# Altium integrated library esd_library.IntLib: 994 symbols (part 4 of 6)
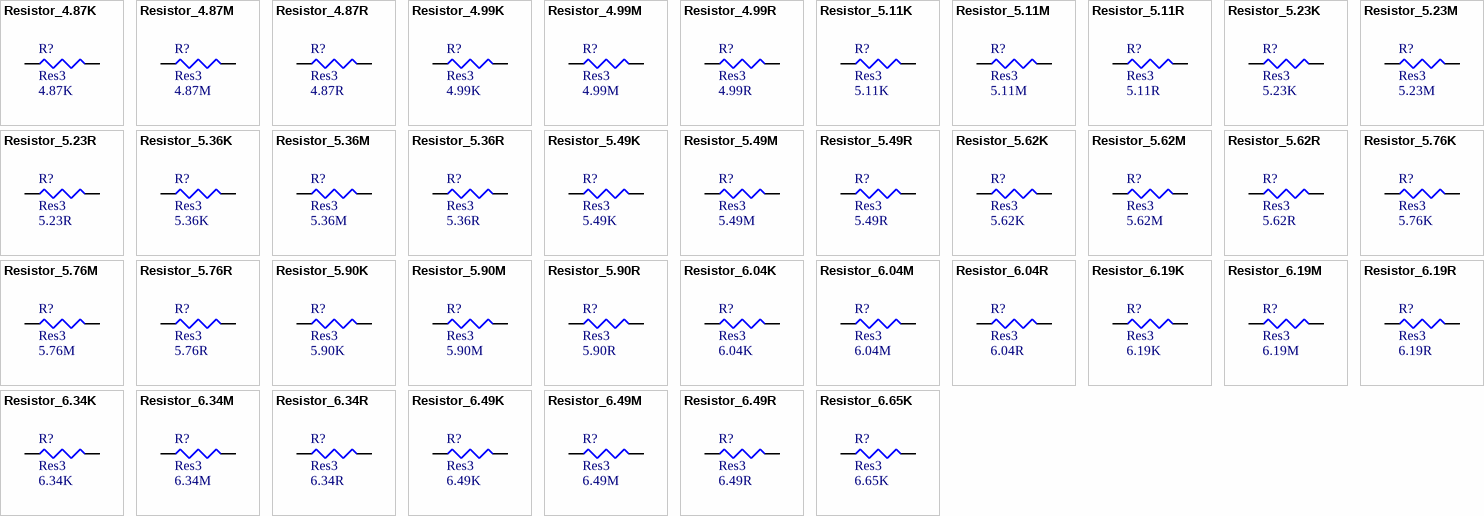
[diagram p30: symbols Resistor_4.87K to Resistor_6.65K]

## Resistor_6.49M
designator R?, comment Res3  value 6.49M
RES SMD 6.49M OHM 1% 1/8W 0805; MPN: CRCW08056M49FKEA; Name: Resistor_6.49M; PN: 541-6.49MCCT-ND; URL: http://www.digikey.ca/product-detail/en/CRCW08056M49FKEA/541-6.49MCCT-ND
footprint RESC2112X05M (Chip Resistor, 2-Leads, Body 2.05x1.25mm, IPC Low Density)
pins: 1, 2

## Resistor_6.49R
designator R?, comment Res3  value 6.49R
RES SMD 6.49R OHM 1% 1/8W 0805; MPN: CRCW08056R49FKEA; Name: Resistor_6.49R; PN: 541-6.49CCCT-ND; URL: http://www.digikey.ca/product-detail/en/CRCW08056R49FKEA/541-6.49CCCT-ND
footprint RESC2112X05M (Chip Resistor, 2-Leads, Body 2.05x1.25mm, IPC Low Density)
pins: 1, 2

## Resistor_6.65K
designator R?, comment Res3  value 6.65K
RES SMD 6.65K OHM 1% 1/8W 0805; MPN: CRCW08056K65FKEA; Name: Resistor_6.65K; PN: 541-6.65KCCT-ND; URL: http://www.digikey.ca/product-detail/en/CRCW08056K65FKEA/541-6.65KCCT-ND
footprint RESC2112X05M (Chip Resistor, 2-Leads, Body 2.05x1.25mm, IPC Low Density)
pins: 1, 2

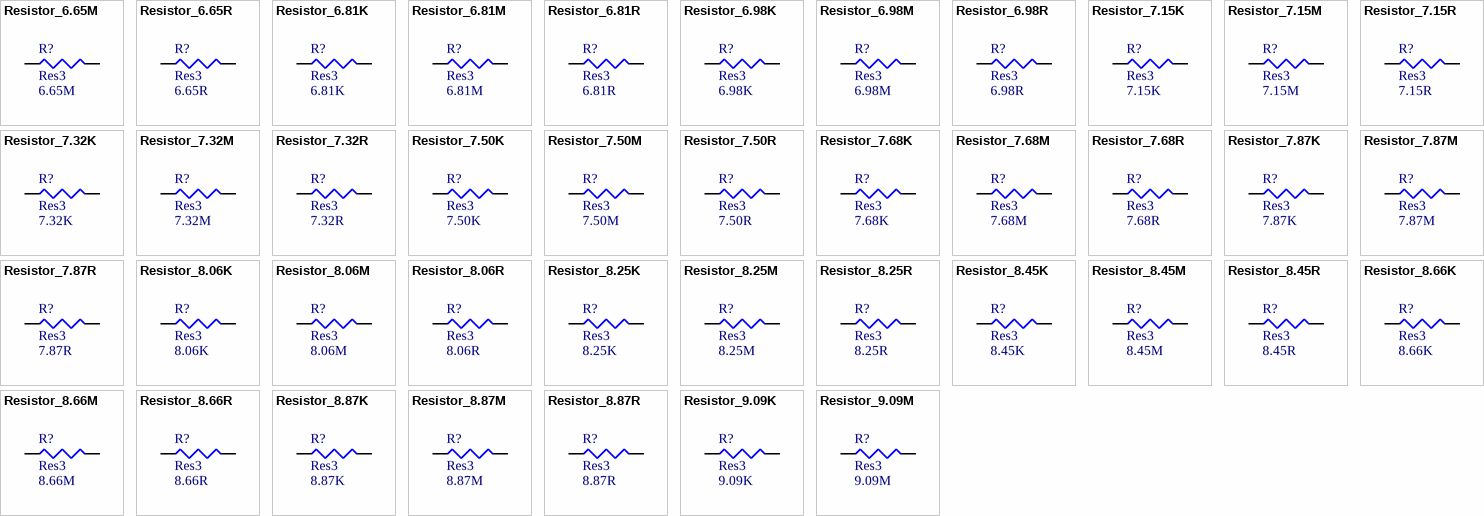
[diagram p17: symbols Resistor_6.65M to Resistor_9.09M]

## Resistor_6.65M
designator R?, comment Res3  value 6.65M
RES SMD 6.65M OHM 1% 1/8W 0805; MPN: CRCW08056M65FKEA; Name: Resistor_6.65M; PN: 541-6.65MCCT-ND; URL: http://www.digikey.ca/product-detail/en/CRCW08056M65FKEA/541-6.65MCCT-ND
footprint RESC2112X05M (Chip Resistor, 2-Leads, Body 2.05x1.25mm, IPC Low Density)
pins: 1, 2

## Resistor_6.65R
designator R?, comment Res3  value 6.65R
RES SMD 6.65R OHM 1% 1/8W 0805; MPN: CRCW08056R65FKEA; Name: Resistor_6.65R; PN: 541-6.65CCCT-ND; URL: http://www.digikey.ca/product-detail/en/CRCW08056R65FKEA/541-6.65CCCT-ND
footprint RESC2112X05M (Chip Resistor, 2-Leads, Body 2.05x1.25mm, IPC Low Density)
pins: 1, 2

## Resistor_6.81K
designator R?, comment Res3  value 6.81K
RES SMD 6.81K OHM 1% 1/8W 0805; MPN: CRCW08056K81FKEA; Name: Resistor_6.81K; PN: 541-6.81KCCT-ND; URL: http://www.digikey.ca/product-detail/en/CRCW08056K81FKEA/541-6.81KCCT-ND
footprint RESC2112X05M (Chip Resistor, 2-Leads, Body 2.05x1.25mm, IPC Low Density)
pins: 1, 2

## Resistor_6.81M
designator R?, comment Res3  value 6.81M
RES SMD 6.81M OHM 1% 1/8W 0805; MPN: CRCW08056M81FKEA; Name: Resistor_6.81M; PN: 541-6.81MCCT-ND; URL: http://www.digikey.ca/product-detail/en/CRCW08056M81FKEA/541-6.81MCCT-ND
footprint RESC2112X05M (Chip Resistor, 2-Leads, Body 2.05x1.25mm, IPC Low Density)
pins: 1, 2

## Resistor_6.81R
designator R?, comment Res3  value 6.81R
RES SMD 6.81R OHM 1% 1/8W 0805; MPN: CRCW08056R81FKEA; Name: Resistor_6.81R; PN: 541-6.81CCCT-ND; URL: http://www.digikey.ca/product-detail/en/CRCW08056R81FKEA/541-6.81CCCT-ND
footprint RESC2112X05M (Chip Resistor, 2-Leads, Body 2.05x1.25mm, IPC Low Density)
pins: 1, 2

## Resistor_6.98K
designator R?, comment Res3  value 6.98K
RES SMD 6.98K OHM 1% 1/8W 0805; MPN: CRCW08056K98FKEA; Name: Resistor_6.98K; PN: 541-6.98KCCT-ND; URL: http://www.digikey.ca/product-detail/en/CRCW08056K98FKEA/541-6.98KCCT-ND
footprint RESC2112X05M (Chip Resistor, 2-Leads, Body 2.05x1.25mm, IPC Low Density)
pins: 1, 2

## Resistor_6.98M
designator R?, comment Res3  value 6.98M
RES SMD 6.98M OHM 1% 1/8W 0805; MPN: CRCW08056M98FKEA; Name: Resistor_6.98M; PN: 541-6.98MCCT-ND; URL: http://www.digikey.ca/product-detail/en/CRCW08056M98FKEA/541-6.98MCCT-ND
footprint RESC2112X05M (Chip Resistor, 2-Leads, Body 2.05x1.25mm, IPC Low Density)
pins: 1, 2

## Resistor_6.98R
designator R?, comment Res3  value 6.98R
RES SMD 6.98R OHM 1% 1/8W 0805; MPN: CRCW08056R98FKEA; Name: Resistor_6.98R; PN: 541-6.98CCCT-ND; URL: http://www.digikey.ca/product-detail/en/CRCW08056R98FKEA/541-6.98CCCT-ND
footprint RESC2112X05M (Chip Resistor, 2-Leads, Body 2.05x1.25mm, IPC Low Density)
pins: 1, 2

## Resistor_7.15K
designator R?, comment Res3  value 7.15K
RES SMD 7.15K OHM 1% 1/8W 0805; MPN: CRCW08057K15FKEA; Name: Resistor_7.15K; PN: 541-7.15KCCT-ND; URL: http://www.digikey.ca/product-detail/en/CRCW08057K15FKEA/541-7.15KCCT-ND
footprint RESC2112X05M (Chip Resistor, 2-Leads, Body 2.05x1.25mm, IPC Low Density)
pins: 1, 2

## Resistor_7.15M
designator R?, comment Res3  value 7.15M
RES SMD 7.15M OHM 1% 1/8W 0805; MPN: CRCW08057M15FKEA; Name: Resistor_7.15M; PN: 541-7.15MCCT-ND; URL: http://www.digikey.ca/product-detail/en/CRCW08057M15FKEA/541-7.15MCCT-ND
footprint RESC2112X05M (Chip Resistor, 2-Leads, Body 2.05x1.25mm, IPC Low Density)
pins: 1, 2

## Resistor_7.15R
designator R?, comment Res3  value 7.15R
RES SMD 7.15R OHM 1% 1/8W 0805; MPN: CRCW08057R15FKEA; Name: Resistor_7.15R; PN: 541-7.15CCCT-ND; URL: http://www.digikey.ca/product-detail/en/CRCW08057R15FKEA/541-7.15CCCT-ND
footprint RESC2112X05M (Chip Resistor, 2-Leads, Body 2.05x1.25mm, IPC Low Density)
pins: 1, 2

## Resistor_7.32K
designator R?, comment Res3  value 7.32K
RES SMD 7.32K OHM 1% 1/8W 0805; MPN: CRCW08057K32FKEA; Name: Resistor_7.32K; PN: 541-7.32KCCT-ND; URL: http://www.digikey.ca/product-detail/en/CRCW08057K32FKEA/541-7.32KCCT-ND
footprint RESC2112X05M (Chip Resistor, 2-Leads, Body 2.05x1.25mm, IPC Low Density)
pins: 1, 2

## Resistor_7.32M
designator R?, comment Res3  value 7.32M
RES SMD 7.32M OHM 1% 1/8W 0805; MPN: CRCW08057M32FKEA; Name: Resistor_7.32M; PN: 541-7.32MCCT-ND; URL: http://www.digikey.ca/product-detail/en/CRCW08057M32FKEA/541-7.32MCCT-ND
footprint RESC2112X05M (Chip Resistor, 2-Leads, Body 2.05x1.25mm, IPC Low Density)
pins: 1, 2

## Resistor_7.32R
designator R?, comment Res3  value 7.32R
RES SMD 7.32R OHM 1% 1/8W 0805; MPN: CRCW08057R32FKEA; Name: Resistor_7.32R; PN: 541-7.32CCCT-ND; URL: http://www.digikey.ca/product-detail/en/CRCW08057R32FKEA/541-7.32CCCT-ND
footprint RESC2112X05M (Chip Resistor, 2-Leads, Body 2.05x1.25mm, IPC Low Density)
pins: 1, 2

## Resistor_7.50K
designator R?, comment Res3  value 7.50K
RES SMD 7.50K OHM 1% 1/8W 0805; MPN: CRCW08057K50FKEA; Name: Resistor_7.50K; PN: 541-7.50KCCT-ND; URL: http://www.digikey.ca/product-detail/en/CRCW08057K50FKEA/541-7.50KCCT-ND
footprint RESC2112X05M (Chip Resistor, 2-Leads, Body 2.05x1.25mm, IPC Low Density)
pins: 1, 2

## Resistor_7.50M
designator R?, comment Res3  value 7.50M
RES SMD 7.50M OHM 1% 1/8W 0805; MPN: CRCW08057M50FKEA; Name: Resistor_7.50M; PN: 541-7.50MCCT-ND; URL: http://www.digikey.ca/product-detail/en/CRCW08057M50FKEA/541-7.50MCCT-ND
footprint RESC2112X05M (Chip Resistor, 2-Leads, Body 2.05x1.25mm, IPC Low Density)
pins: 1, 2

## Resistor_7.50R
designator R?, comment Res3  value 7.50R
RES SMD 7.50R OHM 1% 1/8W 0805; MPN: CRCW08057R50FKEA; Name: Resistor_7.50R; PN: 541-7.50CCCT-ND; URL: http://www.digikey.ca/product-detail/en/CRCW08057R50FKEA/541-7.50CCCT-ND
footprint RESC2112X05M (Chip Resistor, 2-Leads, Body 2.05x1.25mm, IPC Low Density)
pins: 1, 2

## Resistor_7.68K
designator R?, comment Res3  value 7.68K
RES SMD 7.68K OHM 1% 1/8W 0805; MPN: CRCW08057K68FKEA; Name: Resistor_7.68K; PN: 541-7.68KCCT-ND; URL: http://www.digikey.ca/product-detail/en/CRCW08057K68FKEA/541-7.68KCCT-ND
footprint RESC2112X05M (Chip Resistor, 2-Leads, Body 2.05x1.25mm, IPC Low Density)
pins: 1, 2

## Resistor_7.68M
designator R?, comment Res3  value 7.68M
RES SMD 7.68M OHM 1% 1/8W 0805; MPN: CRCW08057M68FKEA; Name: Resistor_7.68M; PN: 541-7.68MCCT-ND; URL: http://www.digikey.ca/product-detail/en/CRCW08057M68FKEA/541-7.68MCCT-ND
footprint RESC2112X05M (Chip Resistor, 2-Leads, Body 2.05x1.25mm, IPC Low Density)
pins: 1, 2

## Resistor_7.68R
designator R?, comment Res3  value 7.68R
RES SMD 7.68R OHM 1% 1/8W 0805; MPN: CRCW08057R68FKEA; Name: Resistor_7.68R; PN: 541-7.68CCCT-ND; URL: http://www.digikey.ca/product-detail/en/CRCW08057R68FKEA/541-7.68CCCT-ND
footprint RESC2112X05M (Chip Resistor, 2-Leads, Body 2.05x1.25mm, IPC Low Density)
pins: 1, 2

## Resistor_7.87K
designator R?, comment Res3  value 7.87K
RES SMD 7.87K OHM 1% 1/8W 0805; MPN: CRCW08057K87FKEA; Name: Resistor_7.87K; PN: 541-7.87KCCT-ND; URL: http://www.digikey.ca/product-detail/en/CRCW08057K87FKEA/541-7.87KCCT-ND
footprint RESC2112X05M (Chip Resistor, 2-Leads, Body 2.05x1.25mm, IPC Low Density)
pins: 1, 2

## Resistor_7.87M
designator R?, comment Res3  value 7.87M
RES SMD 7.87M OHM 1% 1/8W 0805; MPN: CRCW08057M87FKEA; Name: Resistor_7.87M; PN: 541-7.87MCCT-ND; URL: http://www.digikey.ca/product-detail/en/CRCW08057M87FKEA/541-7.87MCCT-ND
footprint RESC2112X05M (Chip Resistor, 2-Leads, Body 2.05x1.25mm, IPC Low Density)
pins: 1, 2

## Resistor_7.87R
designator R?, comment Res3  value 7.87R
RES SMD 7.87R OHM 1% 1/8W 0805; MPN: CRCW08057R87FKEA; Name: Resistor_7.87R; PN: 541-7.87CCCT-ND; URL: http://www.digikey.ca/product-detail/en/CRCW08057R87FKEA/541-7.87CCCT-ND
footprint RESC2112X05M (Chip Resistor, 2-Leads, Body 2.05x1.25mm, IPC Low Density)
pins: 1, 2

## Resistor_8.06K
designator R?, comment Res3  value 8.06K
RES SMD 8.06K OHM 1% 1/8W 0805; MPN: CRCW08058K06FKEA; Name: Resistor_8.06K; PN: 541-8.06KCCT-ND; URL: http://www.digikey.ca/product-detail/en/CRCW08058K06FKEA/541-8.06KCCT-ND
footprint RESC2112X05M (Chip Resistor, 2-Leads, Body 2.05x1.25mm, IPC Low Density)
pins: 1, 2

## Resistor_8.06M
designator R?, comment Res3  value 8.06M
RES SMD 8.06M OHM 1% 1/8W 0805; MPN: CRCW08058M06FKEA; Name: Resistor_8.06M; PN: 541-8.06MCCT-ND; URL: http://www.digikey.ca/product-detail/en/CRCW08058M06FKEA/541-8.06MCCT-ND
footprint RESC2112X05M (Chip Resistor, 2-Leads, Body 2.05x1.25mm, IPC Low Density)
pins: 1, 2

## Resistor_8.06R
designator R?, comment Res3  value 8.06R
RES SMD 8.06R OHM 1% 1/8W 0805; MPN: CRCW08058R06FKEA; Name: Resistor_8.06R; PN: 541-8.06CCCT-ND; URL: http://www.digikey.ca/product-detail/en/CRCW08058R06FKEA/541-8.06CCCT-ND
footprint RESC2112X05M (Chip Resistor, 2-Leads, Body 2.05x1.25mm, IPC Low Density)
pins: 1, 2

## Resistor_8.25K
designator R?, comment Res3  value 8.25K
RES SMD 8.25K OHM 1% 1/8W 0805; MPN: CRCW08058K25FKEA; Name: Resistor_8.25K; PN: 541-8.25KCCT-ND; URL: http://www.digikey.ca/product-detail/en/CRCW08058K25FKEA/541-8.25KCCT-ND
footprint RESC2112X05M (Chip Resistor, 2-Leads, Body 2.05x1.25mm, IPC Low Density)
pins: 1, 2

## Resistor_8.25M
designator R?, comment Res3  value 8.25M
RES SMD 8.25M OHM 1% 1/8W 0805; MPN: CRCW08058M25FKEA; Name: Resistor_8.25M; PN: 541-8.25MCCT-ND; URL: http://www.digikey.ca/product-detail/en/CRCW08058M25FKEA/541-8.25MCCT-ND
footprint RESC2112X05M (Chip Resistor, 2-Leads, Body 2.05x1.25mm, IPC Low Density)
pins: 1, 2

## Resistor_8.25R
designator R?, comment Res3  value 8.25R
RES SMD 8.25R OHM 1% 1/8W 0805; MPN: CRCW08058R25FKEA; Name: Resistor_8.25R; PN: 541-8.25CCCT-ND; URL: http://www.digikey.ca/product-detail/en/CRCW08058R25FKEA/541-8.25CCCT-ND
footprint RESC2112X05M (Chip Resistor, 2-Leads, Body 2.05x1.25mm, IPC Low Density)
pins: 1, 2

## Resistor_8.45K
designator R?, comment Res3  value 8.45K
RES SMD 8.45K OHM 1% 1/8W 0805; MPN: CRCW08058K45FKEA; Name: Resistor_8.45K; PN: 541-8.45KCCT-ND; URL: http://www.digikey.ca/product-detail/en/CRCW08058K45FKEA/541-8.45KCCT-ND
footprint RESC2112X05M (Chip Resistor, 2-Leads, Body 2.05x1.25mm, IPC Low Density)
pins: 1, 2

## Resistor_8.45M
designator R?, comment Res3  value 8.45M
RES SMD 8.45M OHM 1% 1/8W 0805; MPN: CRCW08058M45FKEA; Name: Resistor_8.45M; PN: 541-8.45MCCT-ND; URL: http://www.digikey.ca/product-detail/en/CRCW08058M45FKEA/541-8.45MCCT-ND
footprint RESC2112X05M (Chip Resistor, 2-Leads, Body 2.05x1.25mm, IPC Low Density)
pins: 1, 2

## Resistor_8.45R
designator R?, comment Res3  value 8.45R
RES SMD 8.45R OHM 1% 1/8W 0805; MPN: CRCW08058R45FKEA; Name: Resistor_8.45R; PN: 541-8.45CCCT-ND; URL: http://www.digikey.ca/product-detail/en/CRCW08058R45FKEA/541-8.45CCCT-ND
footprint RESC2112X05M (Chip Resistor, 2-Leads, Body 2.05x1.25mm, IPC Low Density)
pins: 1, 2

## Resistor_8.66K
designator R?, comment Res3  value 8.66K
RES SMD 8.66K OHM 1% 1/8W 0805; MPN: CRCW08058K66FKEA; Name: Resistor_8.66K; PN: 541-8.66KCCT-ND; URL: http://www.digikey.ca/product-detail/en/CRCW08058K66FKEA/541-8.66KCCT-ND
footprint RESC2112X05M (Chip Resistor, 2-Leads, Body 2.05x1.25mm, IPC Low Density)
pins: 1, 2

## Resistor_8.66M
designator R?, comment Res3  value 8.66M
RES SMD 8.66M OHM 1% 1/8W 0805; MPN: CRCW08058M66FKEA; Name: Resistor_8.66M; PN: 541-8.66MCCT-ND; URL: http://www.digikey.ca/product-detail/en/CRCW08058M66FKEA/541-8.66MCCT-ND
footprint RESC2112X05M (Chip Resistor, 2-Leads, Body 2.05x1.25mm, IPC Low Density)
pins: 1, 2

## Resistor_8.66R
designator R?, comment Res3  value 8.66R
RES SMD 8.66R OHM 1% 1/8W 0805; MPN: CRCW08058R66FKEA; Name: Resistor_8.66R; PN: 541-8.66CCCT-ND; URL: http://www.digikey.ca/product-detail/en/CRCW08058R66FKEA/541-8.66CCCT-ND
footprint RESC2112X05M (Chip Resistor, 2-Leads, Body 2.05x1.25mm, IPC Low Density)
pins: 1, 2

## Resistor_8.87K
designator R?, comment Res3  value 8.87K
RES SMD 8.87K OHM 1% 1/8W 0805; MPN: CRCW08058K87FKEA; Name: Resistor_8.87K; PN: 541-8.87KCCT-ND; URL: http://www.digikey.ca/product-detail/en/CRCW08058K87FKEA/541-8.87KCCT-ND
footprint RESC2112X05M (Chip Resistor, 2-Leads, Body 2.05x1.25mm, IPC Low Density)
pins: 1, 2

## Resistor_8.87M
designator R?, comment Res3  value 8.87M
RES SMD 8.87M OHM 1% 1/8W 0805; MPN: CRCW08058M87FKEA; Name: Resistor_8.87M; PN: 541-8.87MCCT-ND; URL: http://www.digikey.ca/product-detail/en/CRCW08058M87FKEA/541-8.87MCCT-ND
footprint RESC2112X05M (Chip Resistor, 2-Leads, Body 2.05x1.25mm, IPC Low Density)
pins: 1, 2

## Resistor_8.87R
designator R?, comment Res3  value 8.87R
RES SMD 8.87R OHM 1% 1/8W 0805; MPN: CRCW08058R87FKEA; Name: Resistor_8.87R; PN: 541-8.87CCCT-ND; URL: http://www.digikey.ca/product-detail/en/CRCW08058R87FKEA/541-8.87CCCT-ND
footprint RESC2112X05M (Chip Resistor, 2-Leads, Body 2.05x1.25mm, IPC Low Density)
pins: 1, 2

## Resistor_9.09K
designator R?, comment Res3  value 9.09K
RES SMD 9.09K OHM 1% 1/8W 0805; MPN: CRCW08059K09FKEA; Name: Resistor_9.09K; PN: 541-9.09KCCT-ND; URL: http://www.digikey.ca/product-detail/en/CRCW08059K09FKEA/541-9.09KCCT-ND
footprint RESC2112X05M (Chip Resistor, 2-Leads, Body 2.05x1.25mm, IPC Low Density)
pins: 1, 2

## Resistor_9.09M
designator R?, comment Res3  value 9.09M
RES SMD 9.09M OHM 1% 1/8W 0805; MPN: CRCW08059M09FKEA; Name: Resistor_9.09M; PN: 541-9.09MCCT-ND; URL: http://www.digikey.ca/product-detail/en/CRCW08059M09FKEA/541-9.09MCCT-ND
footprint RESC2112X05M (Chip Resistor, 2-Leads, Body 2.05x1.25mm, IPC Low Density)
pins: 1, 2

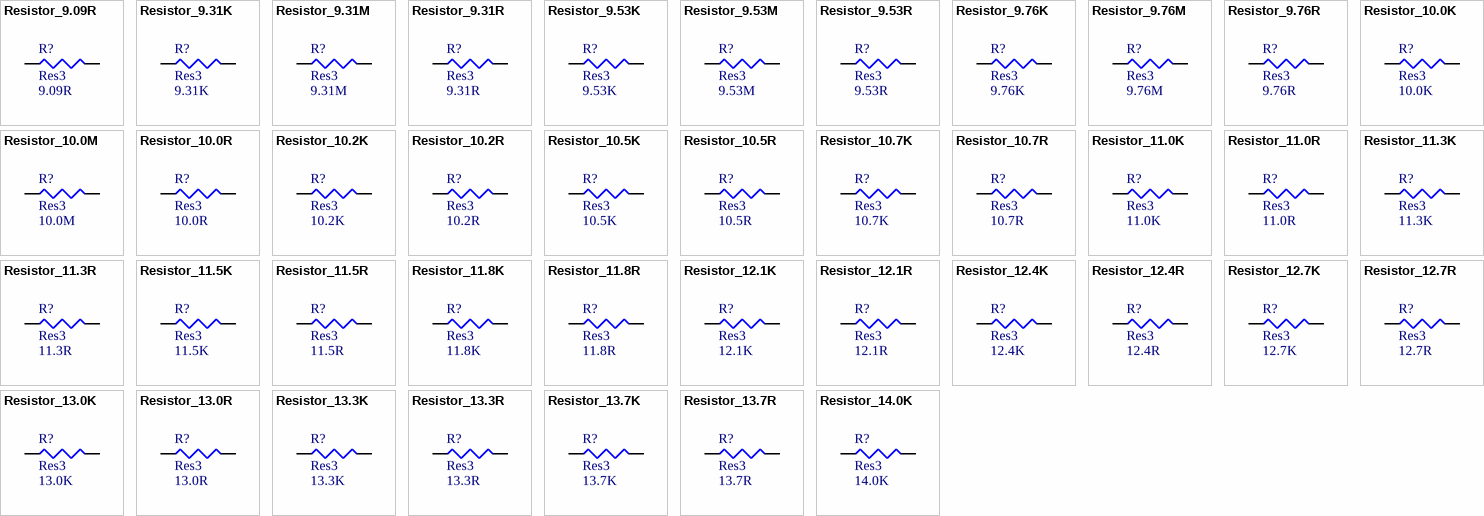
[diagram p18: symbols Resistor_9.09R to Resistor_14.0K]

## Resistor_9.09R
designator R?, comment Res3  value 9.09R
RES SMD 9.09R OHM 1% 1/8W 0805; MPN: CRCW08059R09FKEA; Name: Resistor_9.09R; PN: 541-9.09CCCT-ND; URL: http://www.digikey.ca/product-detail/en/CRCW08059R09FKEA/541-9.09CCCT-ND
footprint RESC2112X05M (Chip Resistor, 2-Leads, Body 2.05x1.25mm, IPC Low Density)
pins: 1, 2

## Resistor_9.31K
designator R?, comment Res3  value 9.31K
RES SMD 9.31K OHM 1% 1/8W 0805; MPN: CRCW08059K31FKEA; Name: Resistor_9.31K; PN: 541-9.31KCCT-ND; URL: http://www.digikey.ca/product-detail/en/CRCW08059K31FKEA/541-9.31KCCT-ND
footprint RESC2112X05M (Chip Resistor, 2-Leads, Body 2.05x1.25mm, IPC Low Density)
pins: 1, 2

## Resistor_9.31M
designator R?, comment Res3  value 9.31M
RES SMD 9.31M OHM 1% 1/8W 0805; MPN: CRCW08059M31FKEA; Name: Resistor_9.31M; PN: 541-9.31MCCT-ND; URL: http://www.digikey.ca/product-detail/en/CRCW08059M31FKEA/541-9.31MCCT-ND
footprint RESC2112X05M (Chip Resistor, 2-Leads, Body 2.05x1.25mm, IPC Low Density)
pins: 1, 2

## Resistor_9.31R
designator R?, comment Res3  value 9.31R
RES SMD 9.31R OHM 1% 1/8W 0805; MPN: CRCW08059R31FKEA; Name: Resistor_9.31R; PN: 541-9.31CCCT-ND; URL: http://www.digikey.ca/product-detail/en/CRCW08059R31FKEA/541-9.31CCCT-ND
footprint RESC2112X05M (Chip Resistor, 2-Leads, Body 2.05x1.25mm, IPC Low Density)
pins: 1, 2

## Resistor_9.53K
designator R?, comment Res3  value 9.53K
RES SMD 9.53K OHM 1% 1/8W 0805; MPN: CRCW08059K53FKEA; Name: Resistor_9.53K; PN: 541-9.53KCCT-ND; URL: http://www.digikey.ca/product-detail/en/CRCW08059K53FKEA/541-9.53KCCT-ND
footprint RESC2112X05M (Chip Resistor, 2-Leads, Body 2.05x1.25mm, IPC Low Density)
pins: 1, 2

## Resistor_9.53M
designator R?, comment Res3  value 9.53M
RES SMD 9.53M OHM 1% 1/8W 0805; MPN: CRCW08059M53FKEA; Name: Resistor_9.53M; PN: 541-9.53MCCT-ND; URL: http://www.digikey.ca/product-detail/en/CRCW08059M53FKEA/541-9.53MCCT-ND
footprint RESC2112X05M (Chip Resistor, 2-Leads, Body 2.05x1.25mm, IPC Low Density)
pins: 1, 2

## Resistor_9.53R
designator R?, comment Res3  value 9.53R
RES SMD 9.53R OHM 1% 1/8W 0805; MPN: CRCW08059R53FKEA; Name: Resistor_9.53R; PN: 541-9.53CCCT-ND; URL: http://www.digikey.ca/product-detail/en/CRCW08059R53FKEA/541-9.53CCCT-ND
footprint RESC2112X05M (Chip Resistor, 2-Leads, Body 2.05x1.25mm, IPC Low Density)
pins: 1, 2

## Resistor_9.76K
designator R?, comment Res3  value 9.76K
RES SMD 9.76K OHM 1% 1/8W 0805; MPN: CRCW08059K76FKEA; Name: Resistor_9.76K; PN: 541-9.76KCCT-ND; URL: http://www.digikey.ca/product-detail/en/CRCW08059K76FKEA/541-9.76KCCT-ND
footprint RESC2112X05M (Chip Resistor, 2-Leads, Body 2.05x1.25mm, IPC Low Density)
pins: 1, 2

## Resistor_9.76M
designator R?, comment Res3  value 9.76M
RES SMD 9.76M OHM 1% 1/8W 0805; MPN: CRCW08059M76FKEA; Name: Resistor_9.76M; PN: 541-9.76MCCT-ND; URL: http://www.digikey.ca/product-detail/en/CRCW08059M76FKEA/541-9.76MCCT-ND
footprint RESC2112X05M (Chip Resistor, 2-Leads, Body 2.05x1.25mm, IPC Low Density)
pins: 1, 2

## Resistor_9.76R
designator R?, comment Res3  value 9.76R
RES SMD 9.76R OHM 1% 1/8W 0805; MPN: CRCW08059R76FKEA; Name: Resistor_9.76R; PN: 541-9.76CCCT-ND; URL: http://www.digikey.ca/product-detail/en/CRCW08059R76FKEA/541-9.76CCCT-ND
footprint RESC2112X05M (Chip Resistor, 2-Leads, Body 2.05x1.25mm, IPC Low Density)
pins: 1, 2

## Resistor_10.0K
designator R?, comment Res3  value 10.0K
RES SMD 10.0K OHM 1% 1/8W 0805; MPN: CRCW080510K0FKEA; Name: Resistor_10.0K; PN: 541-10.0KCCT-ND; URL: http://www.digikey.ca/product-detail/en/CRCW080510K0FKEA/541-10.0KCCT-ND
footprint RESC2112X05M (Chip Resistor, 2-Leads, Body 2.05x1.25mm, IPC Low Density)
pins: 1, 2

## Resistor_10.0M
designator R?, comment Res3  value 10.0M
RES SMD 10.0M OHM 1% 1/8W 0805; MPN: CRCW080510M0FKEA; Name: Resistor_10.0M; PN: 541-10.0MCCT-ND; URL: http://www.digikey.ca/product-detail/en/CRCW080510M0FKEA/541-10.0MCCT-ND
footprint RESC2112X05M (Chip Resistor, 2-Leads, Body 2.05x1.25mm, IPC Low Density)
pins: 1, 2

## Resistor_10.0R
designator R?, comment Res3  value 10.0R
RES SMD 10.0R OHM 1% 1/8W 0805; MPN: CRCW080510R0FKEA; Name: Resistor_10.0R; PN: 541-10.0CCT-ND; URL: http://www.digikey.ca/product-detail/en/CRCW080510R0FKEA/541-10.0CCT-ND
footprint RESC2112X05M (Chip Resistor, 2-Leads, Body 2.05x1.25mm, IPC Low Density)
pins: 1, 2

## Resistor_10.2K
designator R?, comment Res3  value 10.2K
RES SMD 10.2K OHM 1% 1/8W 0805; MPN: CRCW080510K2FKEA; Name: Resistor_10.2K; PN: 541-10.2KCCT-ND; URL: http://www.digikey.ca/product-detail/en/CRCW080510K2FKEA/541-10.2KCCT-ND
footprint RESC2112X05M (Chip Resistor, 2-Leads, Body 2.05x1.25mm, IPC Low Density)
pins: 1, 2

## Resistor_10.2R
designator R?, comment Res3  value 10.2R
RES SMD 10.2R OHM 1% 1/8W 0805; MPN: CRCW080510R2FKEA; Name: Resistor_10.2R; PN: 541-10.2CCT-ND; URL: http://www.digikey.ca/product-detail/en/CRCW080510R2FKEA/541-10.2CCT-ND
footprint RESC2112X05M (Chip Resistor, 2-Leads, Body 2.05x1.25mm, IPC Low Density)
pins: 1, 2

## Resistor_10.5K
designator R?, comment Res3  value 10.5K
RES SMD 10.5K OHM 1% 1/8W 0805; MPN: CRCW080510K5FKEA; Name: Resistor_10.5K; PN: 541-10.5KCCT-ND; URL: http://www.digikey.ca/product-detail/en/CRCW080510K5FKEA/541-10.5KCCT-ND
footprint RESC2112X05M (Chip Resistor, 2-Leads, Body 2.05x1.25mm, IPC Low Density)
pins: 1, 2

## Resistor_10.5R
designator R?, comment Res3  value 10.5R
RES SMD 10.5R OHM 1% 1/8W 0805; MPN: CRCW080510R5FKEA; Name: Resistor_10.5R; PN: 541-10.5CCT-ND; URL: http://www.digikey.ca/product-detail/en/CRCW080510R5FKEA/541-10.5CCT-ND
footprint RESC2112X05M (Chip Resistor, 2-Leads, Body 2.05x1.25mm, IPC Low Density)
pins: 1, 2

## Resistor_10.7K
designator R?, comment Res3  value 10.7K
RES SMD 10.7K OHM 1% 1/8W 0805; MPN: CRCW080510K7FKEA; Name: Resistor_10.7K; PN: 541-10.7KCCT-ND; URL: http://www.digikey.ca/product-detail/en/CRCW080510K7FKEA/541-10.7KCCT-ND
footprint RESC2112X05M (Chip Resistor, 2-Leads, Body 2.05x1.25mm, IPC Low Density)
pins: 1, 2

## Resistor_10.7R
designator R?, comment Res3  value 10.7R
RES SMD 10.7R OHM 1% 1/8W 0805; MPN: CRCW080510R7FKEA; Name: Resistor_10.7R; PN: 541-10.7CCT-ND; URL: http://www.digikey.ca/product-detail/en/CRCW080510R7FKEA/541-10.7CCT-ND
footprint RESC2112X05M (Chip Resistor, 2-Leads, Body 2.05x1.25mm, IPC Low Density)
pins: 1, 2

## Resistor_11.0K
designator R?, comment Res3  value 11.0K
RES SMD 11.0K OHM 1% 1/8W 0805; MPN: CRCW080511K0FKEA; Name: Resistor_11.0K; PN: 541-11.0KCCT-ND; URL: http://www.digikey.ca/product-detail/en/CRCW080511K0FKEA/541-11.0KCCT-ND
footprint RESC2112X05M (Chip Resistor, 2-Leads, Body 2.05x1.25mm, IPC Low Density)
pins: 1, 2

## Resistor_11.0R
designator R?, comment Res3  value 11.0R
RES SMD 11.0R OHM 1% 1/8W 0805; MPN: CRCW080511R0FKEA; Name: Resistor_11.0R; PN: 541-11.0CCT-ND; URL: http://www.digikey.ca/product-detail/en/CRCW080511R0FKEA/541-11.0CCT-ND
footprint RESC2112X05M (Chip Resistor, 2-Leads, Body 2.05x1.25mm, IPC Low Density)
pins: 1, 2

## Resistor_11.3K
designator R?, comment Res3  value 11.3K
RES SMD 11.3K OHM 1% 1/8W 0805; MPN: CRCW080511K3FKEA; Name: Resistor_11.3K; PN: 541-11.3KCCT-ND; URL: http://www.digikey.ca/product-detail/en/CRCW080511K3FKEA/541-11.3KCCT-ND
footprint RESC2112X05M (Chip Resistor, 2-Leads, Body 2.05x1.25mm, IPC Low Density)
pins: 1, 2

## Resistor_11.3R
designator R?, comment Res3  value 11.3R
RES SMD 11.3R OHM 1% 1/8W 0805; MPN: CRCW080511R3FKEA; Name: Resistor_11.3R; PN: 541-11.3CCT-ND; URL: http://www.digikey.ca/product-detail/en/CRCW080511R3FKEA/541-11.3CCT-ND
footprint RESC2112X05M (Chip Resistor, 2-Leads, Body 2.05x1.25mm, IPC Low Density)
pins: 1, 2

## Resistor_11.5K
designator R?, comment Res3  value 11.5K
RES SMD 11.5K OHM 1% 1/8W 0805; MPN: CRCW080511K5FKEA; Name: Resistor_11.5K; PN: 541-11.5KCCT-ND; URL: http://www.digikey.ca/product-detail/en/CRCW080511K5FKEA/541-11.5KCCT-ND
footprint RESC2112X05M (Chip Resistor, 2-Leads, Body 2.05x1.25mm, IPC Low Density)
pins: 1, 2

## Resistor_11.5R
designator R?, comment Res3  value 11.5R
RES SMD 11.5R OHM 1% 1/8W 0805; MPN: CRCW080511R5FKEA; Name: Resistor_11.5R; PN: 541-11.5CCT-ND; URL: http://www.digikey.ca/product-detail/en/CRCW080511R5FKEA/541-11.5CCT-ND
footprint RESC2112X05M (Chip Resistor, 2-Leads, Body 2.05x1.25mm, IPC Low Density)
pins: 1, 2

## Resistor_11.8K
designator R?, comment Res3  value 11.8K
RES SMD 11.8K OHM 1% 1/8W 0805; MPN: CRCW080511K8FKEA; Name: Resistor_11.8K; PN: 541-11.8KCCT-ND; URL: http://www.digikey.ca/product-detail/en/CRCW080511K8FKEA/541-11.8KCCT-ND
footprint RESC2112X05M (Chip Resistor, 2-Leads, Body 2.05x1.25mm, IPC Low Density)
pins: 1, 2

## Resistor_11.8R
designator R?, comment Res3  value 11.8R
RES SMD 11.8R OHM 1% 1/8W 0805; MPN: CRCW080511R8FKEA; Name: Resistor_11.8R; PN: 541-11.8CCT-ND; URL: http://www.digikey.ca/product-detail/en/CRCW080511R8FKEA/541-11.8CCT-ND
footprint RESC2112X05M (Chip Resistor, 2-Leads, Body 2.05x1.25mm, IPC Low Density)
pins: 1, 2

## Resistor_12.1K
designator R?, comment Res3  value 12.1K
RES SMD 12.1K OHM 1% 1/8W 0805; MPN: CRCW080512K1FKEA; Name: Resistor_12.1K; PN: 541-12.1KCCT-ND; URL: http://www.digikey.ca/product-detail/en/CRCW080512K1FKEA/541-12.1KCCT-ND
footprint RESC2112X05M (Chip Resistor, 2-Leads, Body 2.05x1.25mm, IPC Low Density)
pins: 1, 2

## Resistor_12.1R
designator R?, comment Res3  value 12.1R
RES SMD 12.1R OHM 1% 1/8W 0805; MPN: CRCW080512R1FKEA; Name: Resistor_12.1R; PN: 541-12.1CCT-ND; URL: http://www.digikey.ca/product-detail/en/CRCW080512R1FKEA/541-12.1CCT-ND
footprint RESC2112X05M (Chip Resistor, 2-Leads, Body 2.05x1.25mm, IPC Low Density)
pins: 1, 2

## Resistor_12.4K
designator R?, comment Res3  value 12.4K
RES SMD 12.4K OHM 1% 1/8W 0805; MPN: CRCW080512K4FKEA; Name: Resistor_12.4K; PN: 541-12.4KCCT-ND; URL: http://www.digikey.ca/product-detail/en/CRCW080512K4FKEA/541-12.4KCCT-ND
footprint RESC2112X05M (Chip Resistor, 2-Leads, Body 2.05x1.25mm, IPC Low Density)
pins: 1, 2

## Resistor_12.4R
designator R?, comment Res3  value 12.4R
RES SMD 12.4R OHM 1% 1/8W 0805; MPN: CRCW080512R4FKEA; Name: Resistor_12.4R; PN: 541-12.4CCT-ND; URL: http://www.digikey.ca/product-detail/en/CRCW080512R4FKEA/541-12.4CCT-ND
footprint RESC2112X05M (Chip Resistor, 2-Leads, Body 2.05x1.25mm, IPC Low Density)
pins: 1, 2

## Resistor_12.7K
designator R?, comment Res3  value 12.7K
RES SMD 12.7K OHM 1% 1/8W 0805; MPN: CRCW080512K7FKEA; Name: Resistor_12.7K; PN: 541-12.7KCCT-ND; URL: http://www.digikey.ca/product-detail/en/CRCW080512K7FKEA/541-12.7KCCT-ND
footprint RESC2112X05M (Chip Resistor, 2-Leads, Body 2.05x1.25mm, IPC Low Density)
pins: 1, 2

## Resistor_12.7R
designator R?, comment Res3  value 12.7R
RES SMD 12.7R OHM 1% 1/8W 0805; MPN: CRCW080512R7FKEA; Name: Resistor_12.7R; PN: 541-12.7CCT-ND; URL: http://www.digikey.ca/product-detail/en/CRCW080512R7FKEA/541-12.7CCT-ND
footprint RESC2112X05M (Chip Resistor, 2-Leads, Body 2.05x1.25mm, IPC Low Density)
pins: 1, 2

## Resistor_13.0K
designator R?, comment Res3  value 13.0K
RES SMD 13.0K OHM 1% 1/8W 0805; MPN: CRCW080513K0FKEA; Name: Resistor_13.0K; PN: 541-13.0KCCT-ND; URL: http://www.digikey.ca/product-detail/en/CRCW080513K0FKEA/541-13.0KCCT-ND
footprint RESC2112X05M (Chip Resistor, 2-Leads, Body 2.05x1.25mm, IPC Low Density)
pins: 1, 2

## Resistor_13.0R
designator R?, comment Res3  value 13.0R
RES SMD 13.0R OHM 1% 1/8W 0805; MPN: CRCW080513R0FKEA; Name: Resistor_13.0R; PN: 541-13.0CCT-ND; URL: http://www.digikey.ca/product-detail/en/CRCW080513R0FKEA/541-13.0CCT-ND
footprint RESC2112X05M (Chip Resistor, 2-Leads, Body 2.05x1.25mm, IPC Low Density)
pins: 1, 2

## Resistor_13.3K
designator R?, comment Res3  value 13.3K
RES SMD 13.3K OHM 1% 1/8W 0805; MPN: CRCW080513K3FKEA; Name: Resistor_13.3K; PN: 541-13.3KCCT-ND; URL: http://www.digikey.ca/product-detail/en/CRCW080513K3FKEA/541-13.3KCCT-ND
footprint RESC2112X05M (Chip Resistor, 2-Leads, Body 2.05x1.25mm, IPC Low Density)
pins: 1, 2

## Resistor_13.3R
designator R?, comment Res3  value 13.3R
RES SMD 13.3R OHM 1% 1/8W 0805; MPN: CRCW080513R3FKEA; Name: Resistor_13.3R; PN: 541-13.3CCT-ND; URL: http://www.digikey.ca/product-detail/en/CRCW080513R3FKEA/541-13.3CCT-ND
footprint RESC2112X05M (Chip Resistor, 2-Leads, Body 2.05x1.25mm, IPC Low Density)
pins: 1, 2

## Resistor_13.7K
designator R?, comment Res3  value 13.7K
RES SMD 13.7K OHM 1% 1/8W 0805; MPN: CRCW080513K7FKEA; Name: Resistor_13.7K; PN: 541-13.7KCCT-ND; URL: http://www.digikey.ca/product-detail/en/CRCW080513K7FKEA/541-13.7KCCT-ND
footprint RESC2112X05M (Chip Resistor, 2-Leads, Body 2.05x1.25mm, IPC Low Density)
pins: 1, 2

## Resistor_13.7R
designator R?, comment Res3  value 13.7R
RES SMD 13.7R OHM 1% 1/8W 0805; MPN: CRCW080513R7FKEA; Name: Resistor_13.7R; PN: 541-13.7CCT-ND; URL: http://www.digikey.ca/product-detail/en/CRCW080513R7FKEA/541-13.7CCT-ND
footprint RESC2112X05M (Chip Resistor, 2-Leads, Body 2.05x1.25mm, IPC Low Density)
pins: 1, 2

## Resistor_14.0K
designator R?, comment Res3  value 14.0K
RES SMD 14.0K OHM 1% 1/8W 0805; MPN: CRCW080514K0FKEA; Name: Resistor_14.0K; PN: 541-14.0KCCT-ND; URL: http://www.digikey.ca/product-detail/en/CRCW080514K0FKEA/541-14.0KCCT-ND
footprint RESC2112X05M (Chip Resistor, 2-Leads, Body 2.05x1.25mm, IPC Low Density)
pins: 1, 2

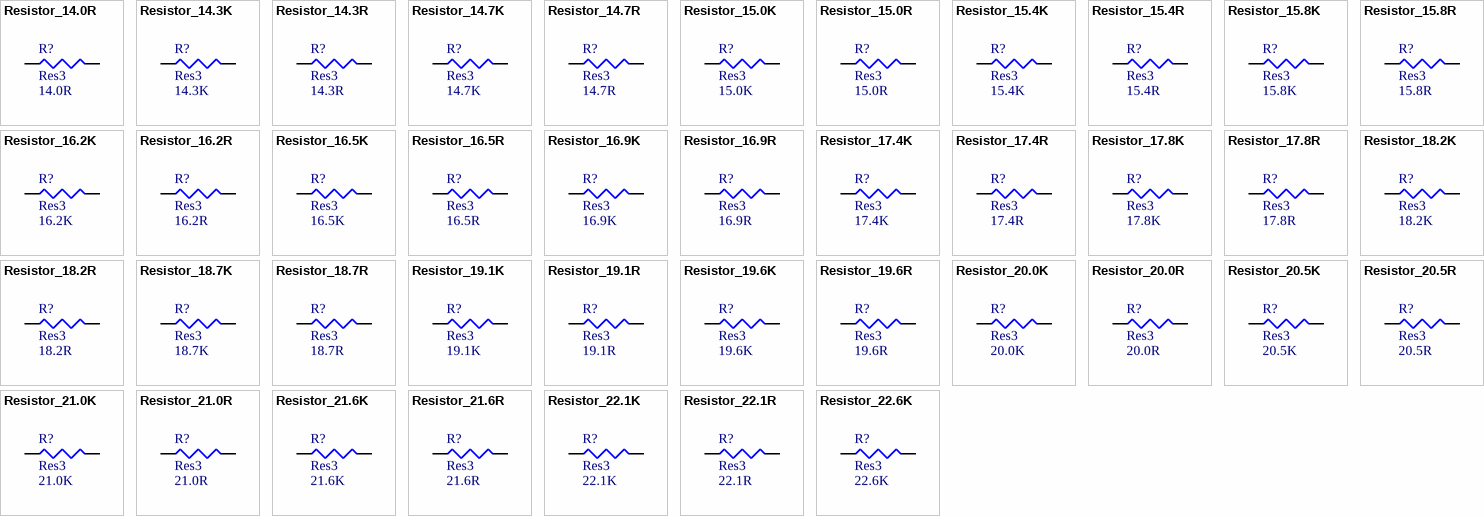
[diagram p19: symbols Resistor_14.0R to Resistor_22.6K]

## Resistor_14.0R
designator R?, comment Res3  value 14.0R
RES SMD 14.0R OHM 1% 1/8W 0805; MPN: CRCW080514R0FKEA; Name: Resistor_14.0R; PN: 541-14.0CCT-ND; URL: http://www.digikey.ca/product-detail/en/CRCW080514R0FKEA/541-14.0CCT-ND
footprint RESC2112X05M (Chip Resistor, 2-Leads, Body 2.05x1.25mm, IPC Low Density)
pins: 1, 2

## Resistor_14.3K
designator R?, comment Res3  value 14.3K
RES SMD 14.3K OHM 1% 1/8W 0805; MPN: CRCW080514K3FKEA; Name: Resistor_14.3K; PN: 541-14.3KCCT-ND; URL: http://www.digikey.ca/product-detail/en/CRCW080514K3FKEA/541-14.3KCCT-ND
footprint RESC2112X05M (Chip Resistor, 2-Leads, Body 2.05x1.25mm, IPC Low Density)
pins: 1, 2

## Resistor_14.3R
designator R?, comment Res3  value 14.3R
RES SMD 14.3R OHM 1% 1/8W 0805; MPN: CRCW080514R3FKEA; Name: Resistor_14.3R; PN: 541-14.3CCT-ND; URL: http://www.digikey.ca/product-detail/en/CRCW080514R3FKEA/541-14.3CCT-ND
footprint RESC2112X05M (Chip Resistor, 2-Leads, Body 2.05x1.25mm, IPC Low Density)
pins: 1, 2

## Resistor_14.7K
designator R?, comment Res3  value 14.7K
RES SMD 14.7K OHM 1% 1/8W 0805; MPN: CRCW080514K7FKEA; Name: Resistor_14.7K; PN: 541-14.7KCCT-ND; URL: http://www.digikey.ca/product-detail/en/CRCW080514K7FKEA/541-14.7KCCT-ND
footprint RESC2112X05M (Chip Resistor, 2-Leads, Body 2.05x1.25mm, IPC Low Density)
pins: 1, 2

## Resistor_14.7R
designator R?, comment Res3  value 14.7R
RES SMD 14.7R OHM 1% 1/8W 0805; MPN: CRCW080514R7FKEA; Name: Resistor_14.7R; PN: 541-14.7CCT-ND; URL: http://www.digikey.ca/product-detail/en/CRCW080514R7FKEA/541-14.7CCT-ND
footprint RESC2112X05M (Chip Resistor, 2-Leads, Body 2.05x1.25mm, IPC Low Density)
pins: 1, 2

## Resistor_15.0K
designator R?, comment Res3  value 15.0K
RES SMD 15.0K OHM 1% 1/8W 0805; MPN: CRCW080515K0FKEA; Name: Resistor_15.0K; PN: 541-15.0KCCT-ND; URL: http://www.digikey.ca/product-detail/en/CRCW080515K0FKEA/541-15.0KCCT-ND
footprint RESC2112X05M (Chip Resistor, 2-Leads, Body 2.05x1.25mm, IPC Low Density)
pins: 1, 2

## Resistor_15.0R
designator R?, comment Res3  value 15.0R
RES SMD 15.0R OHM 1% 1/8W 0805; MPN: CRCW080515R0FKEA; Name: Resistor_15.0R; PN: 541-15.0CCT-ND; URL: http://www.digikey.ca/product-detail/en/CRCW080515R0FKEA/541-15.0CCT-ND
footprint RESC2112X05M (Chip Resistor, 2-Leads, Body 2.05x1.25mm, IPC Low Density)
pins: 1, 2

## Resistor_15.4K
designator R?, comment Res3  value 15.4K
RES SMD 15.4K OHM 1% 1/8W 0805; MPN: CRCW080515K4FKEA; Name: Resistor_15.4K; PN: 541-15.4KCCT-ND; URL: http://www.digikey.ca/product-detail/en/CRCW080515K4FKEA/541-15.4KCCT-ND
footprint RESC2112X05M (Chip Resistor, 2-Leads, Body 2.05x1.25mm, IPC Low Density)
pins: 1, 2

## Resistor_15.4R
designator R?, comment Res3  value 15.4R
RES SMD 15.4R OHM 1% 1/8W 0805; MPN: CRCW080515R4FKEA; Name: Resistor_15.4R; PN: 541-15.4CCT-ND; URL: http://www.digikey.ca/product-detail/en/CRCW080515R4FKEA/541-15.4CCT-ND
footprint RESC2112X05M (Chip Resistor, 2-Leads, Body 2.05x1.25mm, IPC Low Density)
pins: 1, 2

## Resistor_15.8K
designator R?, comment Res3  value 15.8K